# Altium footprint library u025Library.PcbLib: 132 footprints (part 7 of 9)
Each footprint in its own frame and in the unit in brackets; x right, y up, seen from the top. Pads: shape width x height; smd on the part's side, far side on the other; paste and mask are expansions set on the pad; w line width, h text height; cw(c..) or ccw(c..) is an arc to the next point about the centre after c.
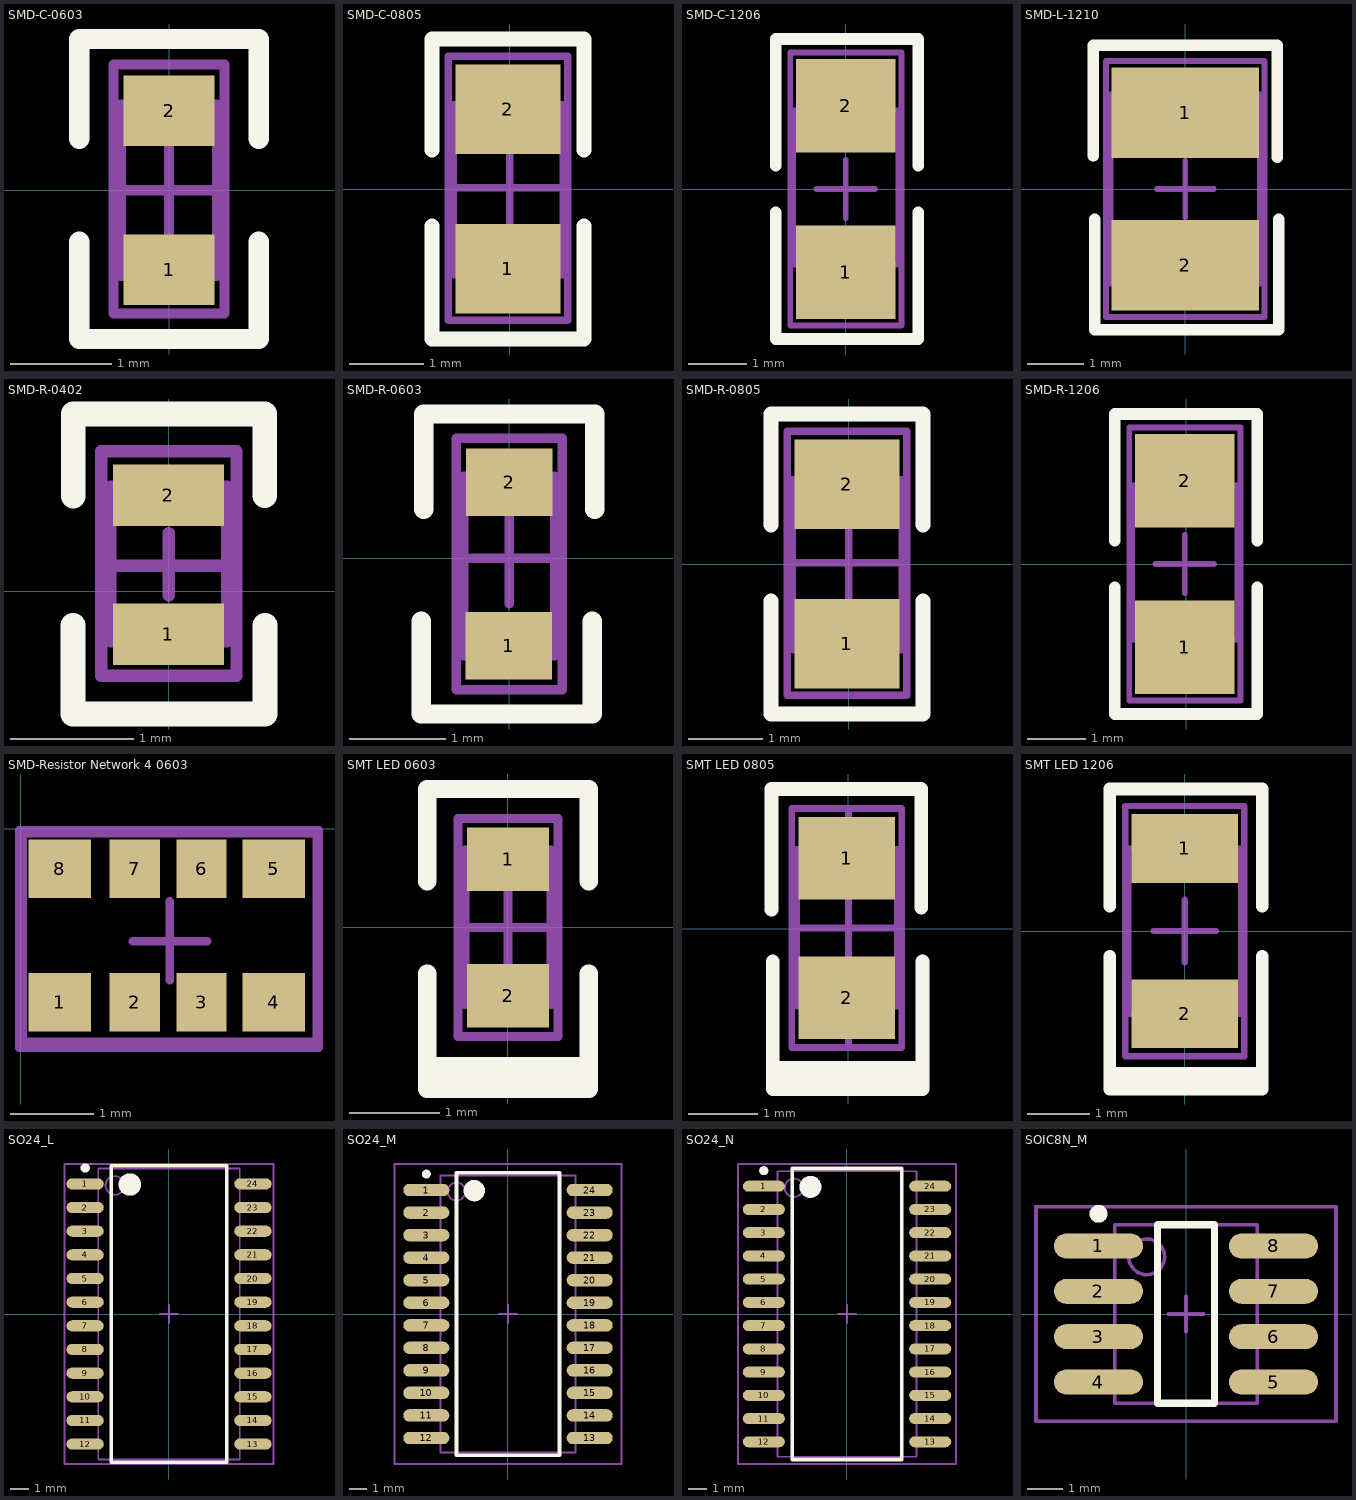
[diagram p6: the footprints below, top view; thin cyan lines are the x and y axes]

## SMD-C-0603 [mm] "Chip, Body 1.6x0.8mm, IPC High Density"
height 2
pads (2):
  rect 0.9x0.7 smd: 1(0,-0.787) 2(0,0.787)
Top Overlay:
  lines w0.2: -0.889,-0.508 -0.889,-1.473 0.889,-1.473 0.889,-0.508 ; -0.889,0.508 -0.889,1.499 0.889,1.499 0.889,0.508
Mechanical 13:
  lines w0.1: -0.475,-0.85 0.475,-0.85 0.475,0.85 -0.475,0.85 -0.475,-0.85
Mechanical 15:
  lines w0.1: -0.475,0 0.475,0 ; 0,-0.475 0,0.475 ; -0.55,-1.219 0.55,-1.219 0.55,1.245 -0.55,1.245 -0.55,-1.219
3D body: height 0.9, standoff 0, extent -0.4,-0.825 0.4,0.775

## SMD-C-0805 [mm] "Chip  , Body 2 x 1.2mm, IPC High Density"
height 2
pads (2):
  rect 1.4x1.2 smd: 1(-0.025,-1.067) 2(-0.025,1.067)
Top Overlay:
  lines w0.2: -1.041,-0.494 -1.041,-2.007 0.991,-2.007 0.991,-0.494 ; -1.041,0.522 -1.041,2.007 0.991,2.007 0.991,0.522
Mechanical 13:
  lines w0.1: -0.754,-1.143 -0.754,1.129 ; -0.748,1.125 0.711,1.125 0.711,-1.151 -0.737,-1.151
Mechanical 15:
  lines w0.1: -0.794,0.014 0.775,0.014 ; 0,-1.524 0,1.499 ; -0.825,-1.753 -0.825,1.778 0.775,1.778 0.775,-1.753 -0.825,-1.753
3D body: height 1, standoff 0, extent -0.65,-1.025 0.6,0.975

## SMD-C-1206 [mm] "Chip , Body 3.2x1.6mm, IPC High Density"
height 2
pads (2):
  rect 1.7x1.6 smd: 1(0,-1.422) 2(0,1.422)
Top Overlay:
  lines w0.2: -1.2,-0.4 -1.2,-2.565 1.241,-2.565 1.241,-0.4 ; -1.2,0.4 -1.2,2.565 1.241,2.565 1.241,0.4
Mechanical 13:
  lines w0.1: -0.9,-1.295 0.9,-1.295 0.9,1.346 -0.9,1.346 -0.9,-1.295
Mechanical 15:
  lines w0.1: -0.5,0 0.5,0 ; 0,-0.5 0,0.5 ; -0.95,-2.337 0.95,-2.337 0.95,2.337 -0.95,2.337 -0.95,-2.337
3D body: height 1, standoff 0, extent -0.8,-1.625 0.8,1.575

## SMD-L-1210 [mm] "SMD-L-1210"
height 0.9
pads (2):
  rect 2.6x1.6 smd: 1(0,1.35) 2(0,-1.35)
Top Overlay:
  lines w0.2: -1.625,0.584 -1.625,2.54 1.626,2.54 1.626,0.559 ; -1.6,-0.533 -1.6,-2.489 1.651,-2.489 1.651,-0.533
Mechanical 13:
  lines w0.1: -1.32,-1.675 -1.32,1.675 1.32,1.675 1.32,-1.675 -1.32,-1.675
Mechanical 15:
  lines w0.1: -0.5,0 0.5,0 ; 0,-0.5 0,0.5 ; -1.4,-2.261 -1.4,2.261 1.4,2.261 1.4,-2.261 -1.4,-2.261
3D body: height 1.25, standoff -1.25, extent -1.295,-1.575 1.205,1.625

## SMD-R-0402 [mm] "Chip, Body 10x0.4mm, IPC High Density"
height 0.45
pads (2):
  rect 0.9x0.5 smd: 1(-0.003,-0.348) 2(-0.003,0.782)
Top Overlay:
  lines w0.2: -0.78,-0.277 -0.78,-0.998 0.774,-0.998 ; -0.78,0.774 -0.78,1.443 0.782,1.443 0.782,0.778 ; 0.782,-0.998 0.782,-0.277
Mechanical 13:
  lines w0.1: -0.475,-0.409 -0.475,0.85 0.475,0.85 0.475,-0.409 -0.475,-0.409
Mechanical 15:
  lines w0.1: -0.473,0.209 0.477,0.209 ; 0,-0.034 0,0.475 ; -0.55,-0.688 0.55,-0.688 0.55,1.14 -0.55,1.14 -0.55,-0.688
3D body: height 0.35, standoff 0, extent -0.269,-0.283 0.231,0.717

## SMD-R-0603 [mm] "Chip, Body 1.6x0.8mm, IPC High Density"
height 0.45
pads (2):
  rect 0.9x0.7 smd: 1(-0.005,-0.911) 2(0,0.787)
Top Overlay:
  lines w0.2: -0.914,-0.657 -0.914,-1.622 0.864,-1.622 0.864,-0.657 ; -0.889,0.508 -0.889,1.499 0.889,1.499 0.889,0.508
Mechanical 13:
  lines w0.1: -0.475,-1.016 0.475,-1.016 0.475,0.85 -0.475,0.85 -0.475,-1.016
Mechanical 15:
  lines w0.1: -0.475,0 0.475,0 ; 0,-0.475 0,0.475 ; -0.55,-1.368 -0.55,1.245 0.55,1.245 0.55,-1.368 -0.55,-1.368
3D body: height 0.45, standoff 0, extent -0.425,-0.724 0.425,0.826

## SMD-R-0805 [mm] "Chip  , Body 2 x 1.2mm, IPC High Density"
height 0.45
pads (2):
  rect 1.4x1.2 smd: 1(-0.025,-1.067) 2(-0.025,1.067)
Top Overlay:
  lines w0.2: -1.041,-0.494 -1.041,-2.007 0.991,-2.007 0.991,-0.494 ; -1.041,0.522 -1.041,2.007 0.991,2.007 0.991,0.522
Mechanical 13:
  lines w0.1: -0.754,-1.143 -0.754,1.129 ; -0.748,1.125 0.711,1.125 0.711,-1.151 -0.737,-1.151
Mechanical 15:
  lines w0.1: -0.794,0.014 0.775,0.014 ; 0,-1.524 0,1.499 ; -0.825,-1.753 0.775,-1.753 0.775,1.778 -0.825,1.778 -0.825,-1.753
3D body: height 0.45, standoff 0, extent -0.65,-0.924 0.6,1.076

## SMD-R-1206 [mm] "Chip , Body 3.2x1.6mm, IPC High Density"
height 0.45
pads (2):
  rect 1.7x1.6 smd: 1(-0.025,-1.422) 2(-0.025,1.422)
Top Overlay:
  lines w0.2: -1.225,-0.4 -1.225,-2.565 1.216,-2.565 1.216,-0.4 ; -1.225,0.4 -1.225,2.565 1.216,2.565 1.216,0.4
Mechanical 13:
  lines w0.1: -0.925,-1.295 0.875,-1.295 0.875,1.346 -0.925,1.346 -0.925,-1.295
Mechanical 15:
  lines w0.1: -0.525,0 0.475,0 ; -0.025,-0.5 -0.025,0.5 ; -0.975,-2.337 0.925,-2.337 0.925,2.337 -0.975,2.337 -0.975,-2.337
3D body: height 0.55, standoff 0, extent -0.825,-1.6 0.775,1.6

## SMD-Resistor Network 4 0603 [mm] "SMD-Resistor Network 4 0603 32mm*16mm"
height 1.3
pads (8):
  rect 0.75x0.7 smd: 1(0.465,-2.082) 4(3.029,-2.082) 5(3.029,-0.482) 8(0.465,-0.482)
  rect 0.6x0.7 smd: 2(1.365,-2.082) 3(2.165,-2.082) 6(2.165,-0.482) 7(1.365,-0.482)
Mechanical 13:
  lines w0.1: 3.543,-0.084 3.543,-2.553 0.025,-2.553 0.025,-0.057 3.543,-0.057
Mechanical 15:
  lines w0.1: 1.342,-1.349 2.232,-1.349 ; 1.782,-1.82 1.782,-0.87 ; 3.573,-2.628 -0.023,-2.628 -0.023,-0.018 3.573,-0.018 3.573,-2.627
3D body: height 0.65, standoff 0, extent 0.158,-2.171 3.358,-0.571

## SMT LED 0603 [mm] "SMT LED; 2 Flat Leads"
height 1.2
pads (2):
  rect 0.9x0.7 smd: 1(0,0.75) 2(0,-0.75)
Top Overlay:
  lines w0.2: -0.889,-1.524 0.889,-1.524 0.889,-0.508 0.889,-1.651 -0.889,-1.651 -0.889,-0.508 ; -0.889,-1.194 -0.889,-1.778 0.889,-1.778 0.889,-0.762 ; -0.889,0.508 -0.889,1.524 0.889,1.524 0.889,0.508
Mechanical 13:
  lines w0.1: -0.475,-0.85 0.475,-0.85 0.475,0.85 -0.475,0.85 -0.475,-0.85
Mechanical 15:
  lines w0.1: -0.475,0 0.475,0 ; 0,-0.475 0,0.475 ; -0.55,-1.2 0.55,-1.2 0.55,1.2 -0.55,1.2 -0.55,-1.2
3D body: height 0.68, standoff 0, extent -0.342,-0.909 0.383,0.741

## SMT LED 0805 [mm] "SMT LED; 2 Flat Leads"
height 0.9
pads (2):
  rect 1.4x1.2 smd: 1(-0.025,1.025) 2(-0.025,-1.002)
Top Overlay:
  lines w0.2: -1.118,0.279 -1.118,2.029 ; -1.118,2.032 1.057,2.032 1.057,0.305 ; -1.1,-0.476 -1.1,-2.328 1.075,-2.328 ; -1.041,-2.018 0.991,-2.018 ; -0.939,-2.201 0.951,-2.201 1.075,-2.325 1.075,-0.476 ; -0.939,-2.074 0.839,-2.074
Mechanical 13:
  lines w0.1: -0.754,-1.118 -0.754,1.155 ; -0.748,1.151 0.711,1.151 0.711,-1.125 -0.737,-1.125
Mechanical 15:
  lines w0.1: -0.794,0.014 0.775,0.014 ; 0,-1.725 0,1.725 ; 0.75,1.75 -0.825,1.75 -0.825,-1.725 0.775,-1.725 0.775,1.75
3D body: height 0.85, standoff 0.01, extent -0.421,-0.971 0.485,1.092

## SMT LED 1206 [mm] "SMT LED; 2 Flat Leads"
height 1.3
pads (2):
  rect 1.7x1.1 smd: 1(0,1.321) 2(0,-1.321)
Top Overlay:
  lines w0.2: -1.2,-2.398 1.241,-2.398 ; -1.2,-2.271 1.241,-2.271 ; -1.2,-0.406 -1.2,-2.525 1.241,-2.525 1.241,-0.406 ; -1.2,0.4 -1.2,2.271 1.241,2.271 1.241,0.4
Mechanical 13:
  lines w0.1: -0.9,-1.321 0.9,-1.321 0.9,1.321 -0.9,1.321 -0.9,-1.321
Mechanical 15:
  lines w0.1: -0.5,0 0.5,0 ; 0,-0.5 0,0.5 ; -0.95,-2 0.95,-2 0.95,2 -0.95,2 -0.95,-2
3D body: height 1.11, standoff -0.4, extent -0.787,-1.549 0.813,1.651

## SO24_L [mm] "SOIC, 24-Leads, Body 15.4x7.5mm, Pitch 1.27mm, IPC High Density"
height 2.65
pads (24):
  oval 2x0.6 smd: 1(-4.5,6.985) 2(-4.5,5.715) 3(-4.5,4.445) 4(-4.5,3.175) 5(-4.5,1.905) 6(-4.5,0.635) 7(-4.5,-0.635) 8(-4.5,-1.905) 9(-4.5,-3.175) 10(-4.5,-4.445) 11(-4.5,-5.715) 12(-4.5,-6.985) 13(4.5,-6.985) 14(4.5,-5.715) 15(4.5,-4.445) 16(4.5,-3.175) 17(4.5,-1.905) 18(4.5,-0.635) 19(4.5,0.635) 20(4.5,1.905) 21(4.5,3.175) 22(4.5,4.445) 23(4.5,5.715) 24(4.5,6.985)
Top Overlay:
  circle w0.6: c-2.1,6.95 r0.3
  circle w0.25: c-4.5,7.835 r0.125
  lines w0.2: -3.1,-7.95 3.1,-7.95 3.1,7.95 -3.1,7.95 -3.1,-7.95
Mechanical 13:
  circle w0.1: c-2.9,6.9 r0.5
  lines w0.1: -3.8,-7.8 3.8,-7.8 3.8,7.8 -3.8,7.8 -3.8,-7.8
Mechanical 15:
  lines w0.1: -0.5,0 0.5,0 ; 0,-0.5 0,0.5 ; -5.6,-8.05 5.6,-8.05 5.6,8.05 -5.6,8.05 -5.6,-8.05
3D body: height 2.57, standoff -0.03, extent -5.349,-7.809 5.251,7.791

## SO24_M [mm] "SOIC, 24-Leads, Body 15.4x7.5mm, Pitch 1.27mm, IPC Low Density"
height 2.65
pads (24):
  oval 2.6x0.7 smd: 1(-4.6,6.985) 2(-4.6,5.715) 3(-4.6,4.445) 4(-4.6,3.175) 5(-4.6,1.905) 6(-4.6,0.635) 7(-4.6,-0.635) 8(-4.6,-1.905) 9(-4.6,-3.175) 10(-4.6,-4.445) 11(-4.6,-5.715) 12(-4.6,-6.985) 13(4.6,-6.985) 14(4.6,-5.715) 15(4.6,-4.445) 16(4.6,-3.175) 17(4.6,-1.905) 18(4.6,-0.635) 19(4.6,0.635) 20(4.6,1.905) 21(4.6,3.175) 22(4.6,4.445) 23(4.6,5.715) 24(4.6,6.985)
Top Overlay:
  circle w0.25: c-4.6,7.885 r0.125
  circle w0.6: c-1.9,6.95 r0.3
  lines w0.2: -2.9,-7.95 -2.9,7.95 2.9,7.95 2.9,-7.95 -2.9,-7.95
Mechanical 13:
  circle w0.1: c-2.9,6.9 r0.5
  lines w0.1: -3.8,-7.8 -3.8,7.8 3.8,7.8 3.8,-7.8 -3.8,-7.8
Mechanical 15:
  lines w0.1: -0.5,0 0.5,0 ; 0,-0.5 0,0.5 ; -6.4,-8.45 -6.4,8.45 6.4,8.45 6.4,-8.45 -6.4,-8.45
3D body: height 2.57, standoff -0.03, extent -5.245,-7.829 5.355,7.771

## SO24_N [mm] "SOIC, 24-Leads, Body 15.4x7.5mm, Pitch 1.27mm, IPC Medium Density"
height 2.65
pads (24):
  oval 2.3x0.6 smd: 1(-4.55,6.985) 2(-4.55,5.715) 3(-4.55,4.445) 4(-4.55,3.175) 5(-4.55,1.905) 6(-4.55,0.635) 7(-4.55,-0.635) 8(-4.55,-1.905) 9(-4.55,-3.175) 10(-4.55,-4.445) 11(-4.55,-5.715) 12(-4.55,-6.985) 13(4.55,-6.985) 14(4.55,-5.715) 15(4.55,-4.445) 16(4.55,-3.175) 17(4.55,-1.905) 18(4.55,-0.635) 19(4.55,0.635) 20(4.55,1.905) 21(4.55,3.175) 22(4.55,4.445) 23(4.55,5.715) 24(4.55,6.985)
Top Overlay:
  circle w0.6: c-2,6.95 r0.3
  circle w0.25: c-4.55,7.835 r0.125
  lines w0.2: -3,-7.95 3,-7.95 3,7.95 -3,7.95 -3,-7.95
Mechanical 13:
  circle w0.1: c-2.9,6.9 r0.5
  lines w0.1: -3.8,-7.8 3.8,-7.8 3.8,7.8 -3.8,7.8 -3.8,-7.8
Mechanical 15:
  lines w0.1: -0.5,0 0.5,0 ; 0,-0.5 0,0.5 ; -5.95,-8.2 5.95,-8.2 5.95,8.2 -5.95,8.2 -5.95,-8.2
3D body: height 2.57, standoff -0.03, extent -5.195,-7.773 5.405,7.827

## SOIC8N_M [mm] "SOIC, 8-Leads, Body 4.9x3.9mm, Pitch 1.27mm, IPC Low Density"
height 1.75
pads (8):
  oval 2.5x0.7 smd: 1(-2.45,1.905) 2(-2.45,0.635) 3(-2.45,-0.635) 4(-2.45,-1.905) 5(2.45,-1.905) 6(2.45,-0.635) 7(2.45,0.635) 8(2.45,1.905)
Top Overlay:
  circle w0.25: c-2.45,2.805 r0.125
  lines w0.2: -0.8,-2.5 0.8,-2.5 0.8,2.5 -0.8,2.5 -0.8,-2.5
Mechanical 13:
  circle w0.1: c-1.1,1.6 r0.5
  lines w0.1: -2,-2.5 2,-2.5 2,2.5 -2,2.5 -2,-2.5
Mechanical 15:
  lines w0.1: -0.5,0 0.5,0 ; 0,-0.5 0,0.5 ; -4.2,-3 4.2,-3 4.2,3 -4.2,3 -4.2,-3
3D body: height 1.7, standoff 0, extent -2.924,-2.45 3.076,2.45